# Altium integrated library Weidmueller_OMNIMATE_Signal.IntLib: 2550 symbols (part 16 of 45)
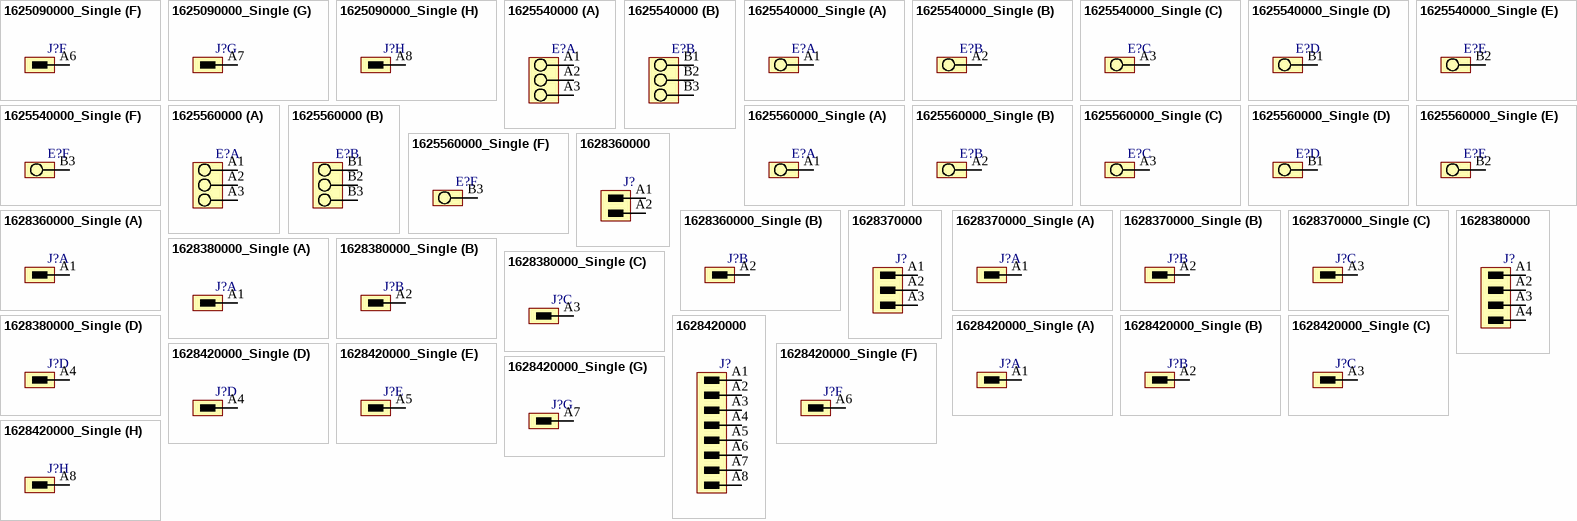
[diagram p226: symbols 1625090000_Single to 1628420000_Single]

## 1628420000_Single
designator J?
OMNIMATE Signal - series BL/SL 7.50; PartNumber: 1628420000; Manufacturer: Weidmueller; Short_text_for_material: SL 7.50/08/90 3.2SN OR BX; Side_termination_characteristic: open side; Mounting_onto_the_PCB: Solder connection; Pitch_mm: 7.5 mm; Pitch_inch: 0.295 inch; No_of_poles: 8; Outgoing_elbow: 90°; Solder_pin_length_mm: 3.2 mm; Contact_material: CuSn; Contact_surface: tinned; Insulating_material: PBT; UL_94_flammability_rating: V-0; Rated_voltage_for_surge_voltage_class_pollution_degree_II_2: 800 V; Rated_current_min_no_of_poles_TU_20_deg_C: 32 A; Rated_voltage_use_group_B_UL_1059: 300 V; Rated_current_use_group_B_UL_1059: 15 A; PackageReference: SL_7_50_90_08; Colour: Orange; Packaging: Box; Qty: 50 PCS; Revision: V1; ComponentLink1Description: Manufacturer URL; ComponentLink1URL: http://www.weidmueller.com/; ComponentLink2Description: URL Link1; ComponentLink2URL: http://catalog.weidmueller.com/catalog/Start.do?localeId=en&ObjectID=1628420000
footprint SL_7_50_90_08 (OMNIMATE Signal - Serie BL/SL 7.50  SL 7.50/08/90 3.2)
part A pins: A1
part B pins: A2
part C pins: A3
part D pins: A4
part E pins: A5
part F pins: A6
part G pins: A7
part H pins: A8

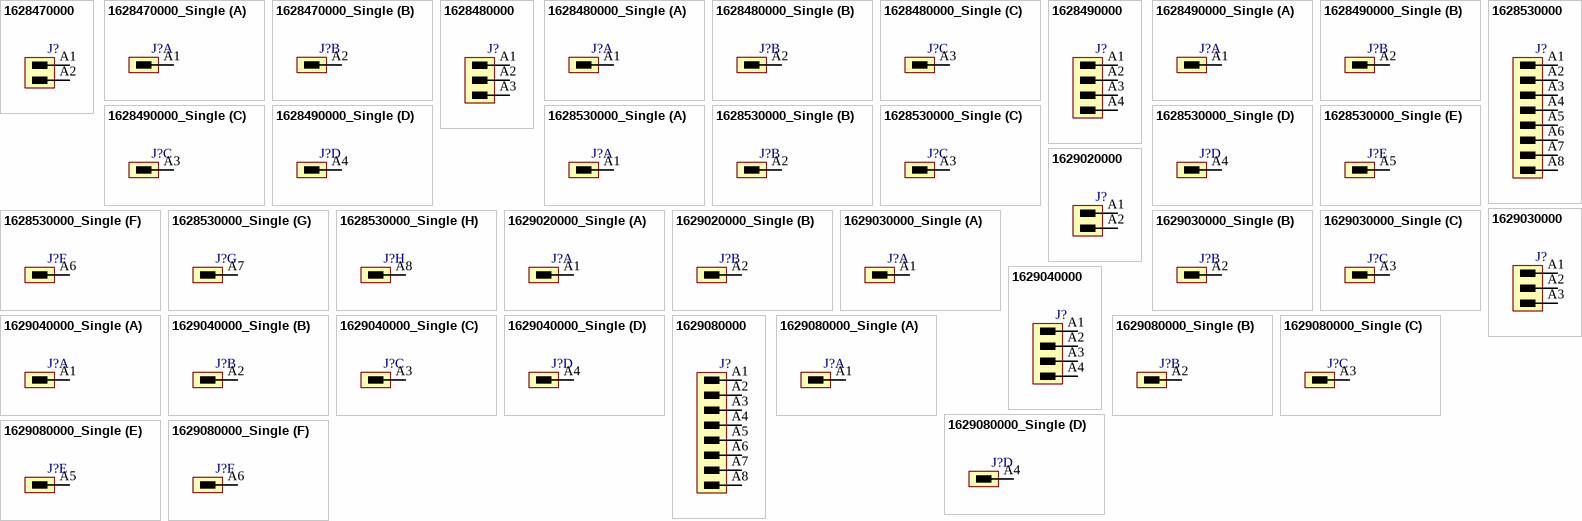
[diagram p87: symbols 1628470000 to 1629080000_Single]

## 1628470000
designator J?
OMNIMATE Signal - series BL/SL 7.50; PartNumber: 1628470000; Manufacturer: Weidmueller; Short_text_for_material: SL 7.50/02/90B 3.2SN OR BX; Side_termination_characteristic: Dovetails for fixing blocks; Mounting_onto_the_PCB: Solder connection; Pitch_mm: 7.5 mm; Pitch_inch: 0.295 inch; No_of_poles: 2; Outgoing_elbow: 90°; Solder_pin_length_mm: 3.2 mm; Contact_material: CuSn; Contact_surface: tinned; Insulating_material: PBT; UL_94_flammability_rating: V-0; Rated_voltage_for_surge_voltage_class_pollution_degree_II_2: 800 V; Rated_current_min_no_of_poles_TU_20_deg_C: 32 A; Rated_voltage_use_group_B_UL_1059: 300 V; Rated_current_use_group_B_UL_1059: 15 A; PackageReference: SL_7_50_90B_02; Colour: Orange; Packaging: Box; Qty: 100 PCS; Revision: V1; ComponentLink1Description: Manufacturer URL; ComponentLink1URL: http://www.weidmueller.com/; ComponentLink2Description: URL Link1; ComponentLink2URL: http://catalog.weidmueller.com/catalog/Start.do?localeId=en&ObjectID=1628470000
footprint SL_7_50_90B_02 (OMNIMATE Signal - Serie BL/SL 7.50  SL 7.50/02/90B 3.2)
pins: A1, A2

## 1628470000_Single
designator J?
OMNIMATE Signal - series BL/SL 7.50; PartNumber: 1628470000; Manufacturer: Weidmueller; Short_text_for_material: SL 7.50/02/90B 3.2SN OR BX; Side_termination_characteristic: Dovetails for fixing blocks; Mounting_onto_the_PCB: Solder connection; Pitch_mm: 7.5 mm; Pitch_inch: 0.295 inch; No_of_poles: 2; Outgoing_elbow: 90°; Solder_pin_length_mm: 3.2 mm; Contact_material: CuSn; Contact_surface: tinned; Insulating_material: PBT; UL_94_flammability_rating: V-0; Rated_voltage_for_surge_voltage_class_pollution_degree_II_2: 800 V; Rated_current_min_no_of_poles_TU_20_deg_C: 32 A; Rated_voltage_use_group_B_UL_1059: 300 V; Rated_current_use_group_B_UL_1059: 15 A; PackageReference: SL_7_50_90B_02; Colour: Orange; Packaging: Box; Qty: 100 PCS; Revision: V1; ComponentLink1Description: Manufacturer URL; ComponentLink1URL: http://www.weidmueller.com/; ComponentLink2Description: URL Link1; ComponentLink2URL: http://catalog.weidmueller.com/catalog/Start.do?localeId=en&ObjectID=1628470000
footprint SL_7_50_90B_02 (OMNIMATE Signal - Serie BL/SL 7.50  SL 7.50/02/90B 3.2)
part A pins: A1
part B pins: A2

## 1628480000
designator J?
OMNIMATE Signal - series BL/SL 7.50; PartNumber: 1628480000; Manufacturer: Weidmueller; Short_text_for_material: SL 7.50/03/90B 3.2SN OR BX; Side_termination_characteristic: Dovetails for fixing blocks; Mounting_onto_the_PCB: Solder connection; Pitch_mm: 7.5 mm; Pitch_inch: 0.295 inch; No_of_poles: 3; Outgoing_elbow: 90°; Solder_pin_length_mm: 3.2 mm; Contact_material: CuSn; Contact_surface: tinned; Insulating_material: PBT; UL_94_flammability_rating: V-0; Rated_voltage_for_surge_voltage_class_pollution_degree_II_2: 800 V; Rated_current_min_no_of_poles_TU_20_deg_C: 32 A; Rated_voltage_use_group_B_UL_1059: 300 V; Rated_current_use_group_B_UL_1059: 15 A; PackageReference: SL_7_50_90B_03; Colour: Orange; Packaging: Box; Qty: 100 PCS; Revision: V1; ComponentLink1Description: Manufacturer URL; ComponentLink1URL: http://www.weidmueller.com/; ComponentLink2Description: URL Link1; ComponentLink2URL: http://catalog.weidmueller.com/catalog/Start.do?localeId=en&ObjectID=1628480000
footprint SL_7_50_90B_03 (OMNIMATE Signal - Serie BL/SL 7.50  SL 7.50/03/90B 3.2)
pins: A1, A2, A3

## 1628480000_Single
designator J?
OMNIMATE Signal - series BL/SL 7.50; PartNumber: 1628480000; Manufacturer: Weidmueller; Short_text_for_material: SL 7.50/03/90B 3.2SN OR BX; Side_termination_characteristic: Dovetails for fixing blocks; Mounting_onto_the_PCB: Solder connection; Pitch_mm: 7.5 mm; Pitch_inch: 0.295 inch; No_of_poles: 3; Outgoing_elbow: 90°; Solder_pin_length_mm: 3.2 mm; Contact_material: CuSn; Contact_surface: tinned; Insulating_material: PBT; UL_94_flammability_rating: V-0; Rated_voltage_for_surge_voltage_class_pollution_degree_II_2: 800 V; Rated_current_min_no_of_poles_TU_20_deg_C: 32 A; Rated_voltage_use_group_B_UL_1059: 300 V; Rated_current_use_group_B_UL_1059: 15 A; PackageReference: SL_7_50_90B_03; Colour: Orange; Packaging: Box; Qty: 100 PCS; Revision: V1; ComponentLink1Description: Manufacturer URL; ComponentLink1URL: http://www.weidmueller.com/; ComponentLink2Description: URL Link1; ComponentLink2URL: http://catalog.weidmueller.com/catalog/Start.do?localeId=en&ObjectID=1628480000
footprint SL_7_50_90B_03 (OMNIMATE Signal - Serie BL/SL 7.50  SL 7.50/03/90B 3.2)
part A pins: A1
part B pins: A2
part C pins: A3

## 1628490000
designator J?
OMNIMATE Signal - series BL/SL 7.50; PartNumber: 1628490000; Manufacturer: Weidmueller; Short_text_for_material: SL 7.50/04/90B 3.2SN OR BX; Side_termination_characteristic: Dovetails for fixing blocks; Mounting_onto_the_PCB: Solder connection; Pitch_mm: 7.5 mm; Pitch_inch: 0.295 inch; No_of_poles: 4; Outgoing_elbow: 90°; Solder_pin_length_mm: 3.2 mm; Contact_material: CuSn; Contact_surface: tinned; Insulating_material: PBT; UL_94_flammability_rating: V-0; Rated_voltage_for_surge_voltage_class_pollution_degree_II_2: 800 V; Rated_current_min_no_of_poles_TU_20_deg_C: 32 A; Rated_voltage_use_group_B_UL_1059: 300 V; Rated_current_use_group_B_UL_1059: 15 A; PackageReference: SL_7_50_90B_04; Colour: Orange; Packaging: Box; Qty: 100 PCS; Revision: V1; ComponentLink1Description: Manufacturer URL; ComponentLink1URL: http://www.weidmueller.com/; ComponentLink2Description: URL Link1; ComponentLink2URL: http://catalog.weidmueller.com/catalog/Start.do?localeId=en&ObjectID=1628490000
footprint SL_7_50_90B_04 (OMNIMATE Signal - Serie BL/SL 7.50  SL 7.50/04/90B 3.2)
pins: A1, A2, A3, A4

## 1628490000_Single
designator J?
OMNIMATE Signal - series BL/SL 7.50; PartNumber: 1628490000; Manufacturer: Weidmueller; Short_text_for_material: SL 7.50/04/90B 3.2SN OR BX; Side_termination_characteristic: Dovetails for fixing blocks; Mounting_onto_the_PCB: Solder connection; Pitch_mm: 7.5 mm; Pitch_inch: 0.295 inch; No_of_poles: 4; Outgoing_elbow: 90°; Solder_pin_length_mm: 3.2 mm; Contact_material: CuSn; Contact_surface: tinned; Insulating_material: PBT; UL_94_flammability_rating: V-0; Rated_voltage_for_surge_voltage_class_pollution_degree_II_2: 800 V; Rated_current_min_no_of_poles_TU_20_deg_C: 32 A; Rated_voltage_use_group_B_UL_1059: 300 V; Rated_current_use_group_B_UL_1059: 15 A; PackageReference: SL_7_50_90B_04; Colour: Orange; Packaging: Box; Qty: 100 PCS; Revision: V1; ComponentLink1Description: Manufacturer URL; ComponentLink1URL: http://www.weidmueller.com/; ComponentLink2Description: URL Link1; ComponentLink2URL: http://catalog.weidmueller.com/catalog/Start.do?localeId=en&ObjectID=1628490000
footprint SL_7_50_90B_04 (OMNIMATE Signal - Serie BL/SL 7.50  SL 7.50/04/90B 3.2)
part A pins: A1
part B pins: A2
part C pins: A3
part D pins: A4

## 1628530000
designator J?
OMNIMATE Signal - series BL/SL 7.50; PartNumber: 1628530000; Manufacturer: Weidmueller; Short_text_for_material: SL 7.50/08/90B 3.2SN OR BX; Side_termination_characteristic: Dovetails for fixing blocks; Mounting_onto_the_PCB: Solder connection; Pitch_mm: 7.5 mm; Pitch_inch: 0.295 inch; No_of_poles: 8; Outgoing_elbow: 90°; Solder_pin_length_mm: 3.2 mm; Contact_material: CuSn; Contact_surface: tinned; Insulating_material: PBT; UL_94_flammability_rating: V-0; Rated_voltage_for_surge_voltage_class_pollution_degree_II_2: 800 V; Rated_current_min_no_of_poles_TU_20_deg_C: 32 A; Rated_voltage_use_group_B_UL_1059: 300 V; Rated_current_use_group_B_UL_1059: 15 A; PackageReference: SL_7_50_90B_08; Colour: Orange; Packaging: Box; Qty: 50 PCS; Revision: V1; ComponentLink1Description: Manufacturer URL; ComponentLink1URL: http://www.weidmueller.com/; ComponentLink2Description: URL Link1; ComponentLink2URL: http://catalog.weidmueller.com/catalog/Start.do?localeId=en&ObjectID=1628530000
footprint SL_7_50_90B_08 (OMNIMATE Signal - Serie BL/SL 7.50  SL 7.50/08/90B 3.2)
pins: A1, A2, A3, A4, A5, A6, A7, A8

## 1628530000_Single
designator J?
OMNIMATE Signal - series BL/SL 7.50; PartNumber: 1628530000; Manufacturer: Weidmueller; Short_text_for_material: SL 7.50/08/90B 3.2SN OR BX; Side_termination_characteristic: Dovetails for fixing blocks; Mounting_onto_the_PCB: Solder connection; Pitch_mm: 7.5 mm; Pitch_inch: 0.295 inch; No_of_poles: 8; Outgoing_elbow: 90°; Solder_pin_length_mm: 3.2 mm; Contact_material: CuSn; Contact_surface: tinned; Insulating_material: PBT; UL_94_flammability_rating: V-0; Rated_voltage_for_surge_voltage_class_pollution_degree_II_2: 800 V; Rated_current_min_no_of_poles_TU_20_deg_C: 32 A; Rated_voltage_use_group_B_UL_1059: 300 V; Rated_current_use_group_B_UL_1059: 15 A; PackageReference: SL_7_50_90B_08; Colour: Orange; Packaging: Box; Qty: 50 PCS; Revision: V1; ComponentLink1Description: Manufacturer URL; ComponentLink1URL: http://www.weidmueller.com/; ComponentLink2Description: URL Link1; ComponentLink2URL: http://catalog.weidmueller.com/catalog/Start.do?localeId=en&ObjectID=1628530000
footprint SL_7_50_90B_08 (OMNIMATE Signal - Serie BL/SL 7.50  SL 7.50/08/90B 3.2)
part A pins: A1
part B pins: A2
part C pins: A3
part D pins: A4
part E pins: A5
part F pins: A6
part G pins: A7
part H pins: A8

## 1629020000
designator J?
OMNIMATE Signal - series BL/SL 7.50; PartNumber: 1629020000; Manufacturer: Weidmueller; Short_text_for_material: SL 7.50/02/180 3.2SN OR BX; Side_termination_characteristic: open side; Mounting_onto_the_PCB: Solder connection; Pitch_mm: 7.5 mm; Pitch_inch: 0.295 inch; No_of_poles: 2; Outgoing_elbow: 180°; Solder_pin_length_mm: 3.2 mm; Contact_material: CuSn; Contact_surface: tinned; Insulating_material: PBT; UL_94_flammability_rating: V-0; Rated_voltage_for_surge_voltage_class_pollution_degree_II_2: 800 V; Rated_current_min_no_of_poles_TU_20_deg_C: 32 A; Rated_voltage_use_group_B_UL_1059: 300 V; Rated_current_use_group_B_UL_1059: 15 A; PackageReference: SL_7_50_180_02; Colour: Orange; Packaging: Box; Qty: 100 PCS; Revision: V1; ComponentLink1Description: Manufacturer URL; ComponentLink1URL: http://www.weidmueller.com/; ComponentLink2Description: URL Link1; ComponentLink2URL: http://catalog.weidmueller.com/catalog/Start.do?localeId=en&ObjectID=1629020000
footprint SL_7_50_180_02 (OMNIMATE Signal - Serie BL/SL 7.50  SL 7.50/02/180 3.2)
pins: A1, A2

## 1629020000_Single
designator J?
OMNIMATE Signal - series BL/SL 7.50; PartNumber: 1629020000; Manufacturer: Weidmueller; Short_text_for_material: SL 7.50/02/180 3.2SN OR BX; Side_termination_characteristic: open side; Mounting_onto_the_PCB: Solder connection; Pitch_mm: 7.5 mm; Pitch_inch: 0.295 inch; No_of_poles: 2; Outgoing_elbow: 180°; Solder_pin_length_mm: 3.2 mm; Contact_material: CuSn; Contact_surface: tinned; Insulating_material: PBT; UL_94_flammability_rating: V-0; Rated_voltage_for_surge_voltage_class_pollution_degree_II_2: 800 V; Rated_current_min_no_of_poles_TU_20_deg_C: 32 A; Rated_voltage_use_group_B_UL_1059: 300 V; Rated_current_use_group_B_UL_1059: 15 A; PackageReference: SL_7_50_180_02; Colour: Orange; Packaging: Box; Qty: 100 PCS; Revision: V1; ComponentLink1Description: Manufacturer URL; ComponentLink1URL: http://www.weidmueller.com/; ComponentLink2Description: URL Link1; ComponentLink2URL: http://catalog.weidmueller.com/catalog/Start.do?localeId=en&ObjectID=1629020000
footprint SL_7_50_180_02 (OMNIMATE Signal - Serie BL/SL 7.50  SL 7.50/02/180 3.2)
part A pins: A1
part B pins: A2

## 1629030000
designator J?
OMNIMATE Signal - series BL/SL 7.50; PartNumber: 1629030000; Manufacturer: Weidmueller; Short_text_for_material: SL 7.50/03/180 3.2SN OR BX; Side_termination_characteristic: open side; Mounting_onto_the_PCB: Solder connection; Pitch_mm: 7.5 mm; Pitch_inch: 0.295 inch; No_of_poles: 3; Outgoing_elbow: 180°; Solder_pin_length_mm: 3.2 mm; Contact_material: CuSn; Contact_surface: tinned; Insulating_material: PBT; UL_94_flammability_rating: V-0; Rated_voltage_for_surge_voltage_class_pollution_degree_II_2: 800 V; Rated_current_min_no_of_poles_TU_20_deg_C: 32 A; Rated_voltage_use_group_B_UL_1059: 300 V; Rated_current_use_group_B_UL_1059: 15 A; PackageReference: SL_7_50_180_03; Colour: Orange; Packaging: Box; Qty: 100 PCS; Revision: V1; ComponentLink1Description: Manufacturer URL; ComponentLink1URL: http://www.weidmueller.com/; ComponentLink2Description: URL Link1; ComponentLink2URL: http://catalog.weidmueller.com/catalog/Start.do?localeId=en&ObjectID=1629030000
footprint SL_7_50_180_03 (OMNIMATE Signal - Serie BL/SL 7.50  SL 7.50/03/180 3.2)
pins: A1, A2, A3

## 1629030000_Single
designator J?
OMNIMATE Signal - series BL/SL 7.50; PartNumber: 1629030000; Manufacturer: Weidmueller; Short_text_for_material: SL 7.50/03/180 3.2SN OR BX; Side_termination_characteristic: open side; Mounting_onto_the_PCB: Solder connection; Pitch_mm: 7.5 mm; Pitch_inch: 0.295 inch; No_of_poles: 3; Outgoing_elbow: 180°; Solder_pin_length_mm: 3.2 mm; Contact_material: CuSn; Contact_surface: tinned; Insulating_material: PBT; UL_94_flammability_rating: V-0; Rated_voltage_for_surge_voltage_class_pollution_degree_II_2: 800 V; Rated_current_min_no_of_poles_TU_20_deg_C: 32 A; Rated_voltage_use_group_B_UL_1059: 300 V; Rated_current_use_group_B_UL_1059: 15 A; PackageReference: SL_7_50_180_03; Colour: Orange; Packaging: Box; Qty: 100 PCS; Revision: V1; ComponentLink1Description: Manufacturer URL; ComponentLink1URL: http://www.weidmueller.com/; ComponentLink2Description: URL Link1; ComponentLink2URL: http://catalog.weidmueller.com/catalog/Start.do?localeId=en&ObjectID=1629030000
footprint SL_7_50_180_03 (OMNIMATE Signal - Serie BL/SL 7.50  SL 7.50/03/180 3.2)
part A pins: A1
part B pins: A2
part C pins: A3

## 1629040000
designator J?
OMNIMATE Signal - series BL/SL 7.50; PartNumber: 1629040000; Manufacturer: Weidmueller; Short_text_for_material: SL 7.50/04/180 3.2SN OR BX; Side_termination_characteristic: open side; Mounting_onto_the_PCB: Solder connection; Pitch_mm: 7.5 mm; Pitch_inch: 0.295 inch; No_of_poles: 4; Outgoing_elbow: 180°; Solder_pin_length_mm: 3.2 mm; Contact_material: CuSn; Contact_surface: tinned; Insulating_material: PBT; UL_94_flammability_rating: V-0; Rated_voltage_for_surge_voltage_class_pollution_degree_II_2: 800 V; Rated_current_min_no_of_poles_TU_20_deg_C: 32 A; Rated_voltage_use_group_B_UL_1059: 300 V; Rated_current_use_group_B_UL_1059: 15 A; PackageReference: SL_7_50_180_04; Colour: Orange; Packaging: Box; Qty: 100 PCS; Revision: V1; ComponentLink1Description: Manufacturer URL; ComponentLink1URL: http://www.weidmueller.com/; ComponentLink2Description: URL Link1; ComponentLink2URL: http://catalog.weidmueller.com/catalog/Start.do?localeId=en&ObjectID=1629040000
footprint SL_7_50_180_04 (OMNIMATE Signal - Serie BL/SL 7.50  SL 7.50/04/180 3.2)
pins: A1, A2, A3, A4

## 1629040000_Single
designator J?
OMNIMATE Signal - series BL/SL 7.50; PartNumber: 1629040000; Manufacturer: Weidmueller; Short_text_for_material: SL 7.50/04/180 3.2SN OR BX; Side_termination_characteristic: open side; Mounting_onto_the_PCB: Solder connection; Pitch_mm: 7.5 mm; Pitch_inch: 0.295 inch; No_of_poles: 4; Outgoing_elbow: 180°; Solder_pin_length_mm: 3.2 mm; Contact_material: CuSn; Contact_surface: tinned; Insulating_material: PBT; UL_94_flammability_rating: V-0; Rated_voltage_for_surge_voltage_class_pollution_degree_II_2: 800 V; Rated_current_min_no_of_poles_TU_20_deg_C: 32 A; Rated_voltage_use_group_B_UL_1059: 300 V; Rated_current_use_group_B_UL_1059: 15 A; PackageReference: SL_7_50_180_04; Colour: Orange; Packaging: Box; Qty: 100 PCS; Revision: V1; ComponentLink1Description: Manufacturer URL; ComponentLink1URL: http://www.weidmueller.com/; ComponentLink2Description: URL Link1; ComponentLink2URL: http://catalog.weidmueller.com/catalog/Start.do?localeId=en&ObjectID=1629040000
footprint SL_7_50_180_04 (OMNIMATE Signal - Serie BL/SL 7.50  SL 7.50/04/180 3.2)
part A pins: A1
part B pins: A2
part C pins: A3
part D pins: A4

## 1629080000
designator J?
OMNIMATE Signal - series BL/SL 7.50; PartNumber: 1629080000; Manufacturer: Weidmueller; Short_text_for_material: SL 7.50/08/180 3.2SN OR BX; Side_termination_characteristic: open side; Mounting_onto_the_PCB: Solder connection; Pitch_mm: 7.5 mm; Pitch_inch: 0.295 inch; No_of_poles: 8; Outgoing_elbow: 180°; Solder_pin_length_mm: 3.2 mm; Contact_material: CuSn; Contact_surface: tinned; Insulating_material: PBT; UL_94_flammability_rating: V-0; Rated_voltage_for_surge_voltage_class_pollution_degree_II_2: 800 V; Rated_current_min_no_of_poles_TU_20_deg_C: 32 A; Rated_voltage_use_group_B_UL_1059: 300 V; Rated_current_use_group_B_UL_1059: 15 A; PackageReference: SL_7_50_180_08; Colour: Orange; Packaging: Box; Qty: 50 PCS; Revision: V1; ComponentLink1Description: Manufacturer URL; ComponentLink1URL: http://www.weidmueller.com/; ComponentLink2Description: URL Link1; ComponentLink2URL: http://catalog.weidmueller.com/catalog/Start.do?localeId=en&ObjectID=1629080000
footprint SL_7_50_180_08 (OMNIMATE Signal - Serie BL/SL 7.50  SL 7.50/08/180 3.2)
pins: A1, A2, A3, A4, A5, A6, A7, A8

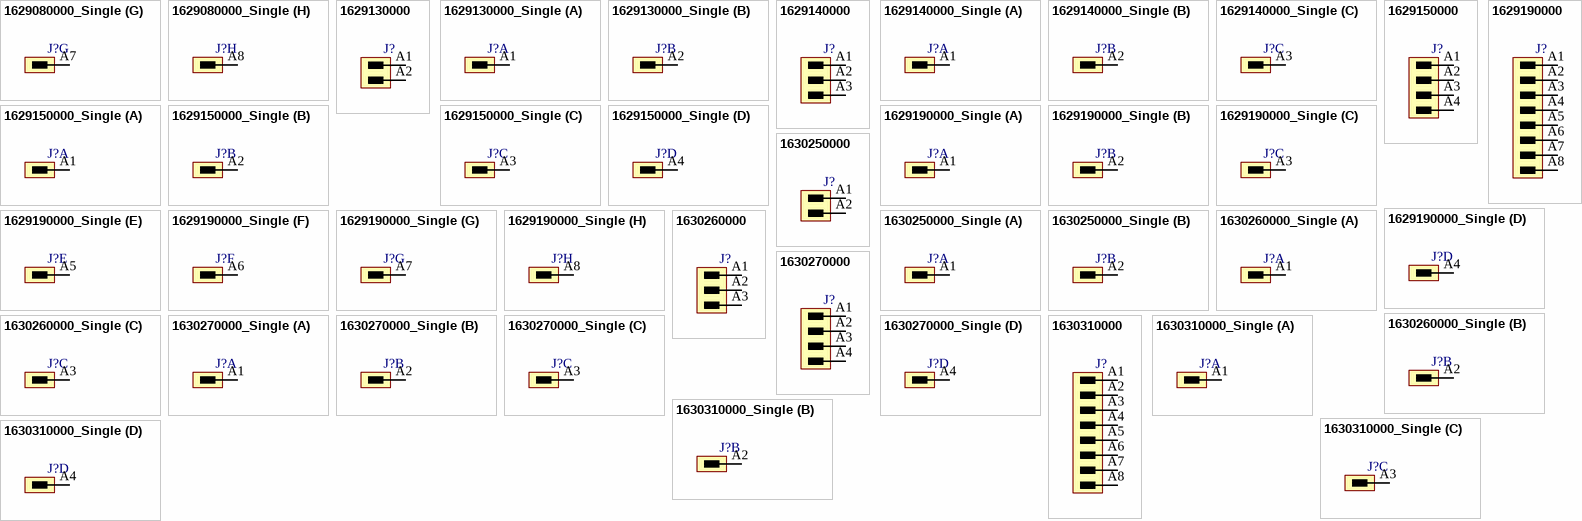
[diagram p88: symbols 1629080000_Single to 1630310000_Single]

## 1629080000_Single
designator J?
OMNIMATE Signal - series BL/SL 7.50; PartNumber: 1629080000; Manufacturer: Weidmueller; Short_text_for_material: SL 7.50/08/180 3.2SN OR BX; Side_termination_characteristic: open side; Mounting_onto_the_PCB: Solder connection; Pitch_mm: 7.5 mm; Pitch_inch: 0.295 inch; No_of_poles: 8; Outgoing_elbow: 180°; Solder_pin_length_mm: 3.2 mm; Contact_material: CuSn; Contact_surface: tinned; Insulating_material: PBT; UL_94_flammability_rating: V-0; Rated_voltage_for_surge_voltage_class_pollution_degree_II_2: 800 V; Rated_current_min_no_of_poles_TU_20_deg_C: 32 A; Rated_voltage_use_group_B_UL_1059: 300 V; Rated_current_use_group_B_UL_1059: 15 A; PackageReference: SL_7_50_180_08; Colour: Orange; Packaging: Box; Qty: 50 PCS; Revision: V1; ComponentLink1Description: Manufacturer URL; ComponentLink1URL: http://www.weidmueller.com/; ComponentLink2Description: URL Link1; ComponentLink2URL: http://catalog.weidmueller.com/catalog/Start.do?localeId=en&ObjectID=1629080000
footprint SL_7_50_180_08 (OMNIMATE Signal - Serie BL/SL 7.50  SL 7.50/08/180 3.2)
part A pins: A1
part B pins: A2
part C pins: A3
part D pins: A4
part E pins: A5
part F pins: A6
part G pins: A7
part H pins: A8

## 1629130000
designator J?
OMNIMATE Signal - series BL/SL 7.50; PartNumber: 1629130000; Manufacturer: Weidmueller; Short_text_for_material: SL 7.50/02/180B 3.2SN OR BX; Side_termination_characteristic: Dovetails for fixing blocks; Mounting_onto_the_PCB: Solder connection; Pitch_mm: 7.5 mm; Pitch_inch: 0.295 inch; No_of_poles: 2; Outgoing_elbow: 180°; Solder_pin_length_mm: 3.2 mm; Contact_material: CuSn; Contact_surface: tinned; Insulating_material: PBT; UL_94_flammability_rating: V-0; Rated_voltage_for_surge_voltage_class_pollution_degree_II_2: 800 V; Rated_current_min_no_of_poles_TU_20_deg_C: 32 A; Rated_voltage_use_group_B_UL_1059: 300 V; Rated_current_use_group_B_UL_1059: 15 A; PackageReference: SL_7_50_180B_02; Colour: Orange; Packaging: Box; Qty: 100 PCS; Revision: V1; ComponentLink1Description: Manufacturer URL; ComponentLink1URL: http://www.weidmueller.com/; ComponentLink2Description: URL Link1; ComponentLink2URL: http://catalog.weidmueller.com/catalog/Start.do?localeId=en&ObjectID=1629130000
footprint SL_7_50_180B_02 (OMNIMATE Signal - Serie BL/SL 7.50  SL 7.50/02/180B 3.2)
pins: A1, A2

## 1629130000_Single
designator J?
OMNIMATE Signal - series BL/SL 7.50; PartNumber: 1629130000; Manufacturer: Weidmueller; Short_text_for_material: SL 7.50/02/180B 3.2SN OR BX; Side_termination_characteristic: Dovetails for fixing blocks; Mounting_onto_the_PCB: Solder connection; Pitch_mm: 7.5 mm; Pitch_inch: 0.295 inch; No_of_poles: 2; Outgoing_elbow: 180°; Solder_pin_length_mm: 3.2 mm; Contact_material: CuSn; Contact_surface: tinned; Insulating_material: PBT; UL_94_flammability_rating: V-0; Rated_voltage_for_surge_voltage_class_pollution_degree_II_2: 800 V; Rated_current_min_no_of_poles_TU_20_deg_C: 32 A; Rated_voltage_use_group_B_UL_1059: 300 V; Rated_current_use_group_B_UL_1059: 15 A; PackageReference: SL_7_50_180B_02; Colour: Orange; Packaging: Box; Qty: 100 PCS; Revision: V1; ComponentLink1Description: Manufacturer URL; ComponentLink1URL: http://www.weidmueller.com/; ComponentLink2Description: URL Link1; ComponentLink2URL: http://catalog.weidmueller.com/catalog/Start.do?localeId=en&ObjectID=1629130000
footprint SL_7_50_180B_02 (OMNIMATE Signal - Serie BL/SL 7.50  SL 7.50/02/180B 3.2)
part A pins: A1
part B pins: A2

## 1629140000
designator J?
OMNIMATE Signal - series BL/SL 7.50; PartNumber: 1629140000; Manufacturer: Weidmueller; Short_text_for_material: SL 7.50/03/180B 3.2SN OR BX; Side_termination_characteristic: Dovetails for fixing blocks; Mounting_onto_the_PCB: Solder connection; Pitch_mm: 7.5 mm; Pitch_inch: 0.295 inch; No_of_poles: 3; Outgoing_elbow: 180°; Solder_pin_length_mm: 3.2 mm; Contact_material: CuSn; Contact_surface: tinned; Insulating_material: PBT; UL_94_flammability_rating: V-0; Rated_voltage_for_surge_voltage_class_pollution_degree_II_2: 800 V; Rated_current_min_no_of_poles_TU_20_deg_C: 32 A; Rated_voltage_use_group_B_UL_1059: 300 V; Rated_current_use_group_B_UL_1059: 15 A; PackageReference: SL_7_50_180B_03; Colour: Orange; Packaging: Box; Qty: 100 PCS; Revision: V1; ComponentLink1Description: Manufacturer URL; ComponentLink1URL: http://www.weidmueller.com/; ComponentLink2Description: URL Link1; ComponentLink2URL: http://catalog.weidmueller.com/catalog/Start.do?localeId=en&ObjectID=1629140000
footprint SL_7_50_180B_03 (OMNIMATE Signal - Serie BL/SL 7.50  SL 7.50/03/180B 3.2)
pins: A1, A2, A3

## 1629140000_Single
designator J?
OMNIMATE Signal - series BL/SL 7.50; PartNumber: 1629140000; Manufacturer: Weidmueller; Short_text_for_material: SL 7.50/03/180B 3.2SN OR BX; Side_termination_characteristic: Dovetails for fixing blocks; Mounting_onto_the_PCB: Solder connection; Pitch_mm: 7.5 mm; Pitch_inch: 0.295 inch; No_of_poles: 3; Outgoing_elbow: 180°; Solder_pin_length_mm: 3.2 mm; Contact_material: CuSn; Contact_surface: tinned; Insulating_material: PBT; UL_94_flammability_rating: V-0; Rated_voltage_for_surge_voltage_class_pollution_degree_II_2: 800 V; Rated_current_min_no_of_poles_TU_20_deg_C: 32 A; Rated_voltage_use_group_B_UL_1059: 300 V; Rated_current_use_group_B_UL_1059: 15 A; PackageReference: SL_7_50_180B_03; Colour: Orange; Packaging: Box; Qty: 100 PCS; Revision: V1; ComponentLink1Description: Manufacturer URL; ComponentLink1URL: http://www.weidmueller.com/; ComponentLink2Description: URL Link1; ComponentLink2URL: http://catalog.weidmueller.com/catalog/Start.do?localeId=en&ObjectID=1629140000
footprint SL_7_50_180B_03 (OMNIMATE Signal - Serie BL/SL 7.50  SL 7.50/03/180B 3.2)
part A pins: A1
part B pins: A2
part C pins: A3

## 1629150000
designator J?
OMNIMATE Signal - series BL/SL 7.50; PartNumber: 1629150000; Manufacturer: Weidmueller; Short_text_for_material: SL 7.50/04/180B 3.2SN OR BX; Side_termination_characteristic: Dovetails for fixing blocks; Mounting_onto_the_PCB: Solder connection; Pitch_mm: 7.5 mm; Pitch_inch: 0.295 inch; No_of_poles: 4; Outgoing_elbow: 180°; Solder_pin_length_mm: 3.2 mm; Contact_material: CuSn; Contact_surface: tinned; Insulating_material: PBT; UL_94_flammability_rating: V-0; Rated_voltage_for_surge_voltage_class_pollution_degree_II_2: 800 V; Rated_current_min_no_of_poles_TU_20_deg_C: 32 A; Rated_voltage_use_group_B_UL_1059: 300 V; Rated_current_use_group_B_UL_1059: 15 A; PackageReference: SL_7_50_180B_04; Colour: Orange; Packaging: Box; Qty: 100 PCS; Revision: V1; ComponentLink1Description: Manufacturer URL; ComponentLink1URL: http://www.weidmueller.com/; ComponentLink2Description: URL Link1; ComponentLink2URL: http://catalog.weidmueller.com/catalog/Start.do?localeId=en&ObjectID=1629150000
footprint SL_7_50_180B_04 (OMNIMATE Signal - Serie BL/SL 7.50  SL 7.50/04/180B 3.2)
pins: A1, A2, A3, A4

## 1629150000_Single
designator J?
OMNIMATE Signal - series BL/SL 7.50; PartNumber: 1629150000; Manufacturer: Weidmueller; Short_text_for_material: SL 7.50/04/180B 3.2SN OR BX; Side_termination_characteristic: Dovetails for fixing blocks; Mounting_onto_the_PCB: Solder connection; Pitch_mm: 7.5 mm; Pitch_inch: 0.295 inch; No_of_poles: 4; Outgoing_elbow: 180°; Solder_pin_length_mm: 3.2 mm; Contact_material: CuSn; Contact_surface: tinned; Insulating_material: PBT; UL_94_flammability_rating: V-0; Rated_voltage_for_surge_voltage_class_pollution_degree_II_2: 800 V; Rated_current_min_no_of_poles_TU_20_deg_C: 32 A; Rated_voltage_use_group_B_UL_1059: 300 V; Rated_current_use_group_B_UL_1059: 15 A; PackageReference: SL_7_50_180B_04; Colour: Orange; Packaging: Box; Qty: 100 PCS; Revision: V1; ComponentLink1Description: Manufacturer URL; ComponentLink1URL: http://www.weidmueller.com/; ComponentLink2Description: URL Link1; ComponentLink2URL: http://catalog.weidmueller.com/catalog/Start.do?localeId=en&ObjectID=1629150000
footprint SL_7_50_180B_04 (OMNIMATE Signal - Serie BL/SL 7.50  SL 7.50/04/180B 3.2)
part A pins: A1
part B pins: A2
part C pins: A3
part D pins: A4

## 1629190000
designator J?
OMNIMATE Signal - series BL/SL 7.50; PartNumber: 1629190000; Manufacturer: Weidmueller; Short_text_for_material: SL 7.50/08/180B 3.2SN OR BX; Side_termination_characteristic: Dovetails for fixing blocks; Mounting_onto_the_PCB: Solder connection; Pitch_mm: 7.5 mm; Pitch_inch: 0.295 inch; No_of_poles: 8; Outgoing_elbow: 180°; Solder_pin_length_mm: 3.2 mm; Contact_material: CuSn; Contact_surface: tinned; Insulating_material: PBT; UL_94_flammability_rating: V-0; Rated_voltage_for_surge_voltage_class_pollution_degree_II_2: 800 V; Rated_current_min_no_of_poles_TU_20_deg_C: 32 A; Rated_voltage_use_group_B_UL_1059: 300 V; Rated_current_use_group_B_UL_1059: 15 A; PackageReference: SL_7_50_180B_08; Colour: Orange; Packaging: Box; Qty: 50 PCS; Revision: V1; ComponentLink1Description: Manufacturer URL; ComponentLink1URL: http://www.weidmueller.com/; ComponentLink2Description: URL Link1; ComponentLink2URL: http://catalog.weidmueller.com/catalog/Start.do?localeId=en&ObjectID=1629190000
footprint SL_7_50_180B_08 (OMNIMATE Signal - Serie BL/SL 7.50  SL 7.50/08/180B 3.2)
pins: A1, A2, A3, A4, A5, A6, A7, A8

## 1629190000_Single
designator J?
OMNIMATE Signal - series BL/SL 7.50; PartNumber: 1629190000; Manufacturer: Weidmueller; Short_text_for_material: SL 7.50/08/180B 3.2SN OR BX; Side_termination_characteristic: Dovetails for fixing blocks; Mounting_onto_the_PCB: Solder connection; Pitch_mm: 7.5 mm; Pitch_inch: 0.295 inch; No_of_poles: 8; Outgoing_elbow: 180°; Solder_pin_length_mm: 3.2 mm; Contact_material: CuSn; Contact_surface: tinned; Insulating_material: PBT; UL_94_flammability_rating: V-0; Rated_voltage_for_surge_voltage_class_pollution_degree_II_2: 800 V; Rated_current_min_no_of_poles_TU_20_deg_C: 32 A; Rated_voltage_use_group_B_UL_1059: 300 V; Rated_current_use_group_B_UL_1059: 15 A; PackageReference: SL_7_50_180B_08; Colour: Orange; Packaging: Box; Qty: 50 PCS; Revision: V1; ComponentLink1Description: Manufacturer URL; ComponentLink1URL: http://www.weidmueller.com/; ComponentLink2Description: URL Link1; ComponentLink2URL: http://catalog.weidmueller.com/catalog/Start.do?localeId=en&ObjectID=1629190000
footprint SL_7_50_180B_08 (OMNIMATE Signal - Serie BL/SL 7.50  SL 7.50/08/180B 3.2)
part A pins: A1
part B pins: A2
part C pins: A3
part D pins: A4
part E pins: A5
part F pins: A6
part G pins: A7
part H pins: A8

## 1630250000
designator J?
OMNIMATE Signal - series BL/SL 5.00; PartNumber: 1630250000; Manufacturer: Weidmueller; Short_text_for_material: SL 5.00/02/135 3.2SN OR BX; Side_termination_characteristic: open side; Mounting_onto_the_PCB: Solder connection; Pitch_mm: 5 mm; Pitch_inch: 0.197 inch; No_of_poles: 2; Outgoing_elbow: 135°; Solder_pin_length_mm: 3.2 mm; Contact_material: CuSn; Contact_surface: tinned; Insulating_material: PBT; UL_94_flammability_rating: V-0; Rated_voltage_for_surge_voltage_class_pollution_degree_II_2: 400 V; Rated_current_min_no_of_poles_TU_20_deg_C: 32 A; Rated_voltage_use_group_B_UL_1059: 300 V; Rated_current_use_group_B_UL_1059: 15 A; PackageReference: SL_5_00_135_02; Colour: Orange; Packaging: Box; Qty: 100 PCS; Revision: V1; ComponentLink1Description: Manufacturer URL; ComponentLink1URL: http://www.weidmueller.com/; ComponentLink2Description: URL Link1; ComponentLink2URL: http://catalog.weidmueller.com/catalog/Start.do?localeId=en&ObjectID=1630250000
footprint SL_5_00_135_02 (OMNIMATE Signal - Serie BL/SL 5.00  SL 5.00/02/135 3.2)
pins: A1, A2

## 1630250000_Single
designator J?
OMNIMATE Signal - series BL/SL 5.00; PartNumber: 1630250000; Manufacturer: Weidmueller; Short_text_for_material: SL 5.00/02/135 3.2SN OR BX; Side_termination_characteristic: open side; Mounting_onto_the_PCB: Solder connection; Pitch_mm: 5 mm; Pitch_inch: 0.197 inch; No_of_poles: 2; Outgoing_elbow: 135°; Solder_pin_length_mm: 3.2 mm; Contact_material: CuSn; Contact_surface: tinned; Insulating_material: PBT; UL_94_flammability_rating: V-0; Rated_voltage_for_surge_voltage_class_pollution_degree_II_2: 400 V; Rated_current_min_no_of_poles_TU_20_deg_C: 32 A; Rated_voltage_use_group_B_UL_1059: 300 V; Rated_current_use_group_B_UL_1059: 15 A; PackageReference: SL_5_00_135_02; Colour: Orange; Packaging: Box; Qty: 100 PCS; Revision: V1; ComponentLink1Description: Manufacturer URL; ComponentLink1URL: http://www.weidmueller.com/; ComponentLink2Description: URL Link1; ComponentLink2URL: http://catalog.weidmueller.com/catalog/Start.do?localeId=en&ObjectID=1630250000
footprint SL_5_00_135_02 (OMNIMATE Signal - Serie BL/SL 5.00  SL 5.00/02/135 3.2)
part A pins: A1
part B pins: A2

## 1630260000
designator J?
OMNIMATE Signal - series BL/SL 5.00; PartNumber: 1630260000; Manufacturer: Weidmueller; Short_text_for_material: SL 5.00/03/135 3.2SN OR BX; Side_termination_characteristic: open side; Mounting_onto_the_PCB: Solder connection; Pitch_mm: 5 mm; Pitch_inch: 0.197 inch; No_of_poles: 3; Outgoing_elbow: 135°; Solder_pin_length_mm: 3.2 mm; Contact_material: CuSn; Contact_surface: tinned; Insulating_material: PBT; UL_94_flammability_rating: V-0; Rated_voltage_for_surge_voltage_class_pollution_degree_II_2: 400 V; Rated_current_min_no_of_poles_TU_20_deg_C: 32 A; Rated_voltage_use_group_B_UL_1059: 300 V; Rated_current_use_group_B_UL_1059: 15 A; PackageReference: SL_5_00_135_03; Colour: Orange; Packaging: Box; Qty: 100 PCS; Revision: V1; ComponentLink1Description: Manufacturer URL; ComponentLink1URL: http://www.weidmueller.com/; ComponentLink2Description: URL Link1; ComponentLink2URL: http://catalog.weidmueller.com/catalog/Start.do?localeId=en&ObjectID=1630260000
footprint SL_5_00_135_03 (OMNIMATE Signal - Serie BL/SL 5.00  SL 5.00/03/135 3.2)
pins: A1, A2, A3

## 1630260000_Single
designator J?
OMNIMATE Signal - series BL/SL 5.00; PartNumber: 1630260000; Manufacturer: Weidmueller; Short_text_for_material: SL 5.00/03/135 3.2SN OR BX; Side_termination_characteristic: open side; Mounting_onto_the_PCB: Solder connection; Pitch_mm: 5 mm; Pitch_inch: 0.197 inch; No_of_poles: 3; Outgoing_elbow: 135°; Solder_pin_length_mm: 3.2 mm; Contact_material: CuSn; Contact_surface: tinned; Insulating_material: PBT; UL_94_flammability_rating: V-0; Rated_voltage_for_surge_voltage_class_pollution_degree_II_2: 400 V; Rated_current_min_no_of_poles_TU_20_deg_C: 32 A; Rated_voltage_use_group_B_UL_1059: 300 V; Rated_current_use_group_B_UL_1059: 15 A; PackageReference: SL_5_00_135_03; Colour: Orange; Packaging: Box; Qty: 100 PCS; Revision: V1; ComponentLink1Description: Manufacturer URL; ComponentLink1URL: http://www.weidmueller.com/; ComponentLink2Description: URL Link1; ComponentLink2URL: http://catalog.weidmueller.com/catalog/Start.do?localeId=en&ObjectID=1630260000
footprint SL_5_00_135_03 (OMNIMATE Signal - Serie BL/SL 5.00  SL 5.00/03/135 3.2)
part A pins: A1
part B pins: A2
part C pins: A3

## 1630270000
designator J?
OMNIMATE Signal - series BL/SL 5.00; PartNumber: 1630270000; Manufacturer: Weidmueller; Short_text_for_material: SL 5.00/04/135 3.2SN OR BX; Side_termination_characteristic: open side; Mounting_onto_the_PCB: Solder connection; Pitch_mm: 5 mm; Pitch_inch: 0.197 inch; No_of_poles: 4; Outgoing_elbow: 135°; Solder_pin_length_mm: 3.2 mm; Contact_material: CuSn; Contact_surface: tinned; Insulating_material: PBT; UL_94_flammability_rating: V-0; Rated_voltage_for_surge_voltage_class_pollution_degree_II_2: 400 V; Rated_current_min_no_of_poles_TU_20_deg_C: 32 A; Rated_voltage_use_group_B_UL_1059: 300 V; Rated_current_use_group_B_UL_1059: 15 A; PackageReference: SL_5_00_135_04; Colour: Orange; Packaging: Box; Qty: 100 PCS; Revision: V1; ComponentLink1Description: Manufacturer URL; ComponentLink1URL: http://www.weidmueller.com/; ComponentLink2Description: URL Link1; ComponentLink2URL: http://catalog.weidmueller.com/catalog/Start.do?localeId=en&ObjectID=1630270000
footprint SL_5_00_135_04 (OMNIMATE Signal - Serie BL/SL 5.00  SL 5.00/04/135 3.2)
pins: A1, A2, A3, A4

## 1630270000_Single
designator J?